# Altium footprint library LibPCB.PcbLib: 76 footprints (part 2 of 5)
Each footprint in its own frame and in the unit in brackets; x right, y up, seen from the top. Pads: shape width x height; smd on the part's side, far side on the other; paste and mask are expansions set on the pad; w line width, h text height; cw(c..) or ccw(c..) is an arc to the next point about the centre after c.
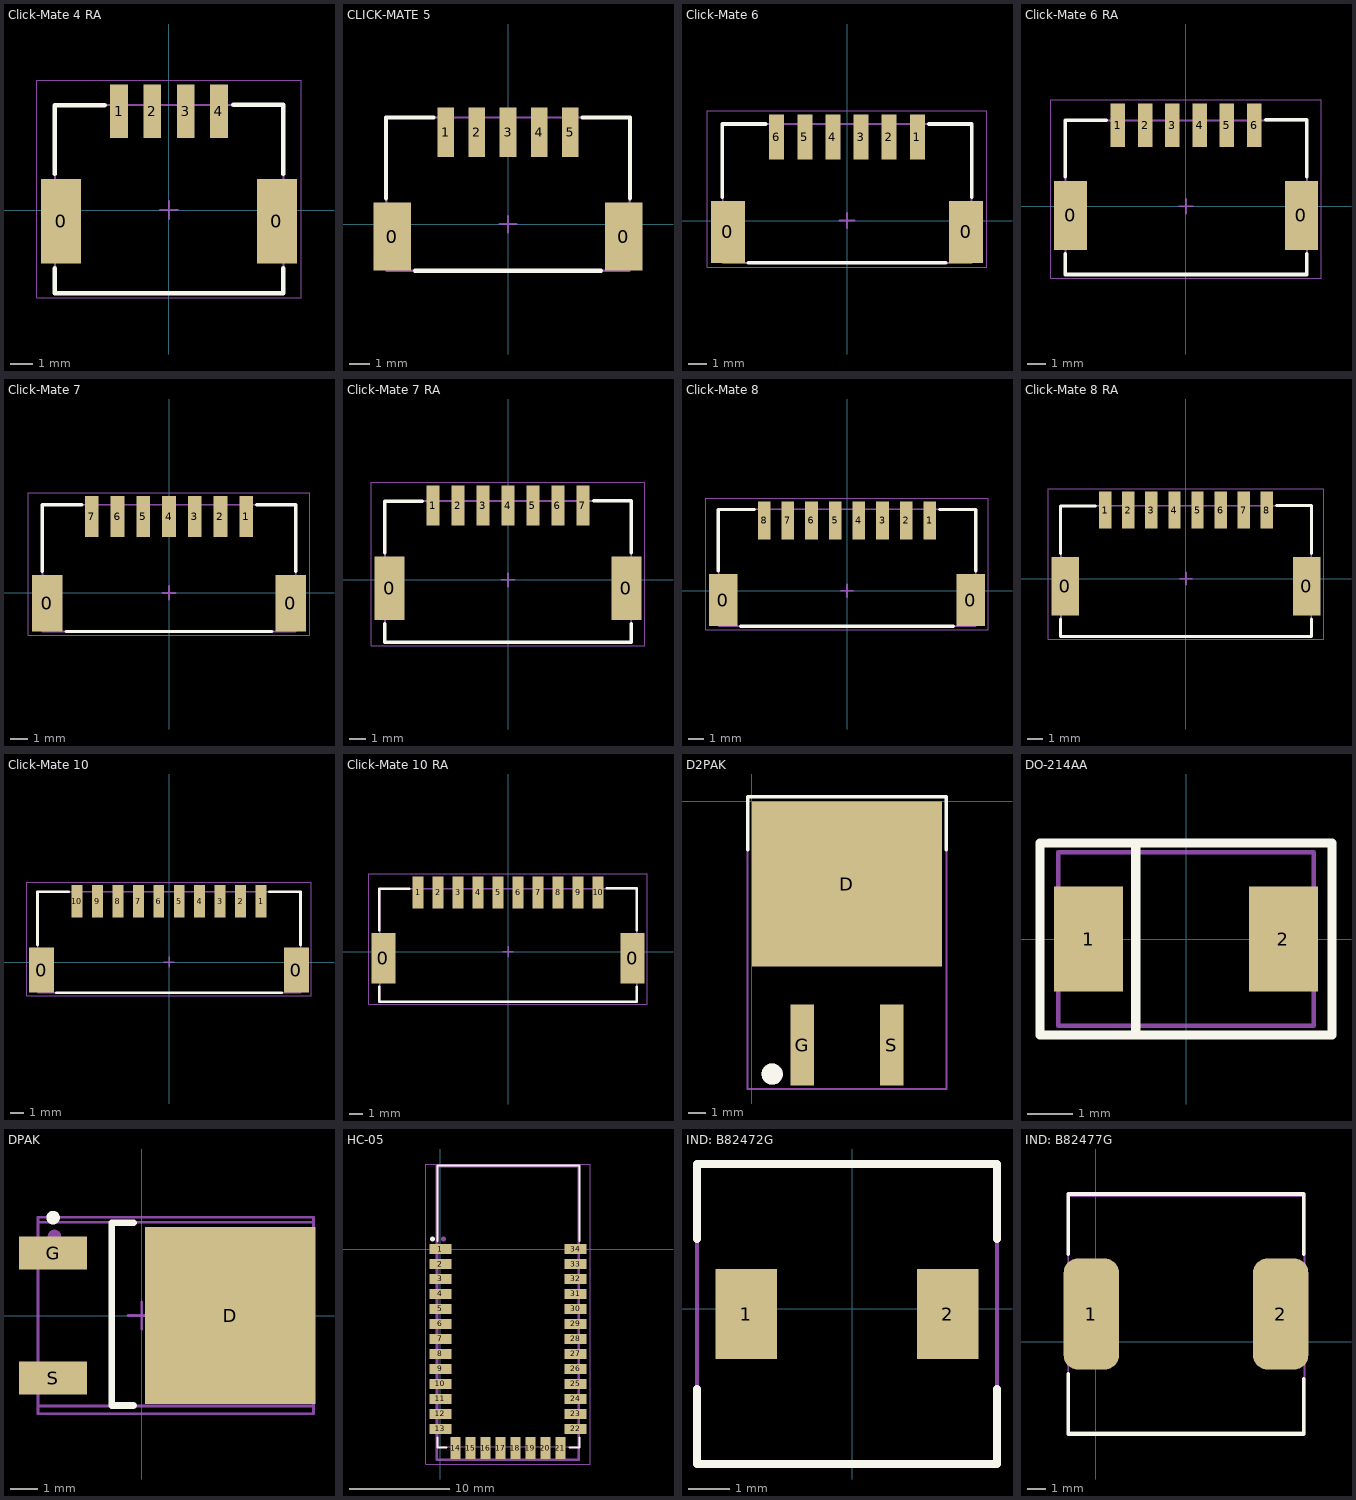
[diagram p1: the footprints below, top view; thin cyan lines are the x and y axes]

## Click-Mate 4 RA [mm]
pads (6):
  rect 1.8x3.8 smd: 0(-4.85,-0.5) 0(4.85,-0.5)
  rect 0.8x2.4 smd: 1(-2.25,4.45) 2(-0.75,4.45) 3(0.75,4.45) 4(2.25,4.45)
Top Overlay:
  lines w0.2: -5.15,-2.625 -5.15,-3.75 5.15,-3.75 5.15,-2.625 ; -5.15,1.625 -5.15,4.725 -2.9,4.725 ; 2.9,4.75 5.15,4.75 5.15,1.625
Mechanical 9:
  text ".Comment" at -0.925,-0.4 h0.6
  text ".Designator" at -1.05,0.15 h0.8
Mechanical 11:
  lines w0.1: 5.15,4.725 -5.125,4.725 -5.125,-3.775 5.15,-3.775 5.15,4.75
Mechanical 15:
  lines w0.05: -5.95,-3.95 5.95,-3.95 5.95,5.85 -5.95,5.85 -5.95,-3.95
  lines w0.1: -0.4,0 0.4,0 ; 0,-0.4 0,0.4
3D body "Click-Mate 4 RA.stp": height 6.4, standoff 0, extent -5.15,-3.78 5.15,4.72

## CLICK-MATE 5 [mm]
pads (7):
  rect 1.8x3.3 smd: 0(-5.6,-0.6) 0(5.6,-0.6)
  rect 0.8x2.4 smd: 1(-3,4.45) 2(-1.5,4.45) 3(0,4.45) 4(1.5,4.45) 5(3,4.45)
Top Overlay:
  lines w0.2: -5.9,1.25 -5.9,5.15 -3.6,5.15 ; -4.5,-2.25 4.5,-2.25 ; 3.6,5.15 5.9,5.15 5.9,1.25
Mechanical 9:
  text ".Comment" at -0.798,-0.4 h0.6
  text ".Designator" at -0.923,0.15 h0.8
Mechanical 11:
  lines w0.1: -5.875,-2.25 5.875,-2.25 5.875,5.15 -5.875,5.15 -5.875,-2.25
Mechanical 15:
  lines w0.1: -0.4,0 0.4,0 ; 0,-0.4 0,0.4
3D body "5025840570.stp": height 7.28, standoff -0.02, extent -5.831,-2.176 5.969,5.224

## Click-Mate 6 [mm] "5054050670"
pads (8):
  rect 1.8x3.3 smd: 0(-6.35,-0.6) 0(6.35,-0.6)
  rect 0.8x2.4 smd: 1(3.75,4.45) 2(2.25,4.45) 3(0.75,4.45) 4(-0.75,4.45) 5(-2.25,4.45) 6(-3.75,4.45)
Top Overlay:
  lines w0.2: -6.65,1.25 -6.65,5.15 -4.35,5.15 ; -5.25,-2.25 5.25,-2.25 ; 4.375,5.15 6.65,5.15 6.65,1.25
Mechanical 9:
  text ".Comment" at -0.925,-0.4 h0.6
  text ".Designator" at -1.05,0.15 h0.8
Mechanical 11:
  lines w0.1: -6.625,-2.25 6.65,-2.25 6.65,5.15 -6.625,5.15 -6.625,-2.25
Mechanical 15:
  lines w0.05: -7.45,-2.475 7.45,-2.475 7.45,5.85 -7.45,5.85 -7.45,-2.475
  lines w0.1: -0.4,0 0.4,0 ; 0,-0.4 0,0.4
3D body "Click-Mate 6 .stp": height 7.28, standoff -0.02, extent -6.65,-2.25 6.65,5.15

## Click-Mate 6 RA [mm]
pads (8):
  rect 1.8x3.8 smd: 0(-6.35,-0.5) 0(6.35,-0.5)
  rect 0.8x2.4 smd: 1(-3.75,4.45) 2(-2.25,4.45) 3(-0.75,4.45) 4(0.75,4.45) 5(2.25,4.45) 6(3.75,4.45)
Top Overlay:
  lines w0.2: -6.65,-2.625 -6.65,-3.75 6.65,-3.75 6.65,-2.625 ; -6.65,1.625 -6.65,4.725 -4.4,4.725 ; 4.4,4.75 6.65,4.75 6.65,1.625
Mechanical 9:
  text ".Designator" at -1.05,0.15 h0.8
  text ".Comment" at -0.925,-0.4 h0.6
Mechanical 11:
  lines w0.1: 6.65,4.725 -6.625,4.725 -6.625,-3.775 6.65,-3.775 6.65,4.75
Mechanical 15:
  lines w0.05: -7.45,-3.95 -7.45,5.85 7.45,5.85 7.45,-3.95 -7.45,-3.95
  lines w0.1: -0.4,0 0.4,0 ; 0,-0.4 0,0.4
3D body "Click-Mate 6.stp": height 6.4, standoff 0, extent -6.65,-3.78 6.65,4.72

## Click-Mate 7 [mm] "505405-0770"
pads (9):
  rect 1.8x3.3 smd: 0(-7.1,-0.6) 0(7.1,-0.6)
  rect 0.8x2.4 smd: 1(4.5,4.45) 2(3,4.45) 3(1.5,4.45) 4(0,4.45) 5(-1.5,4.45) 6(-3,4.45) 7(-4.5,4.45)
Top Overlay:
  lines w0.2: -7.4,1.25 -7.4,5.15 -5.1,5.15 ; -6,-2.25 6,-2.25 ; 5.125,5.15 7.4,5.15 7.4,1.25
Mechanical 9:
  text ".Designator" at -1.05,0.15 h0.8
  text ".Comment" at -0.925,-0.4 h0.6
Mechanical 11:
  lines w0.1: -7.375,-2.25 -7.375,5.15 7.4,5.15 7.4,-2.25 -7.375,-2.25
Mechanical 15:
  lines w0.05: -8.2,-2.475 -8.2,5.85 8.2,5.85 8.2,-2.475 -8.2,-2.475
  lines w0.1: -0.4,0 0.4,0 ; 0,-0.4 0,0.4
3D body "Clik-Mate 7.stp": height 7.28, standoff -0.02, extent -7.4,-2.25 7.4,5.15

## Click-Mate 7 RA [mm]
pads (9):
  rect 1.8x3.8 smd: 0(-7.1,-0.5) 0(7.1,-0.5)
  rect 0.8x2.4 smd: 1(-4.5,4.45) 2(-3,4.45) 3(-1.5,4.45) 4(0,4.45) 5(1.5,4.45) 6(3,4.45) 7(4.5,4.45)
Top Overlay:
  lines w0.2: -7.4,-2.625 -7.4,-3.75 7.4,-3.75 7.4,-2.625 ; -7.4,1.625 -7.4,4.725 -5.15,4.725 ; 5.15,4.75 7.4,4.75 7.4,1.625
Mechanical 9:
  text ".Comment" at -0.925,-0.4 h0.6
  text ".Designator" at -1.05,0.15 h0.8
Mechanical 11:
  lines w0.1: 7.4,4.725 -7.375,4.725 -7.375,-3.775 7.4,-3.775 7.4,4.75
Mechanical 15:
  lines w0.05: -8.2,-3.95 8.2,-3.95 8.2,5.85 -8.2,5.85 -8.2,-3.95
  lines w0.1: -0.4,0 0.4,0 ; 0,-0.4 0,0.4
3D body "Click-Mate 7 RA.stp": height 6.4, standoff 0, extent -7.4,-3.78 7.4,4.72

## Click-Mate 8 [mm] "5054050870"
pads (10):
  rect 1.8x3.3 smd: 0(-7.85,-0.6) 0(7.85,-0.6)
  rect 0.8x2.4 smd: 1(5.25,4.45) 2(3.75,4.45) 3(2.25,4.45) 4(0.75,4.45) 5(-0.75,4.45) 6(-2.25,4.45) 7(-3.75,4.45) 8(-5.25,4.45)
Top Overlay:
  lines w0.2: -8.15,1.25 -8.15,5.15 -5.85,5.15 ; -6.75,-2.25 6.75,-2.25 ; 5.875,5.15 8.15,5.15 8.15,1.25
Mechanical 9:
  text ".Designator" at -1.05,0.15 h0.8
  text ".Comment" at -0.925,-0.4 h0.6
Mechanical 11:
  lines w0.1: -8.125,-2.25 -8.125,5.15 8.15,5.15 8.15,-2.25 -8.125,-2.25
Mechanical 15:
  lines w0.05: -8.95,-2.475 -8.95,5.85 8.95,5.85 8.95,-2.475 -8.95,-2.475
  lines w0.1: -0.4,0 0.4,0 ; 0,-0.4 0,0.4
3D body "Clik-Mate 8.stp": height 7.28, standoff -0.02, extent -8.15,-2.25 8.15,5.15

## Click-Mate 8 RA [mm]
pads (10):
  rect 1.8x3.8 smd: 0(-7.85,-0.5) 0(7.85,-0.5)
  rect 0.8x2.4 smd: 1(-5.25,4.45) 2(-3.75,4.45) 3(-2.25,4.45) 4(-0.75,4.45) 5(0.75,4.45) 6(2.25,4.45) 7(3.75,4.45) 8(5.25,4.45)
Top Overlay:
  lines w0.2: -8.15,-2.625 -8.15,-3.75 8.15,-3.75 8.15,-2.625 ; -8.15,1.625 -8.15,4.725 -5.9,4.725 ; 5.9,4.75 8.15,4.75 8.15,1.625
Mechanical 9:
  text ".Designator" at -1.05,0.15 h0.8
  text ".Comment" at -0.925,-0.4 h0.6
Mechanical 11:
  lines w0.1: 8.15,4.725 -8.125,4.725 -8.125,-3.775 8.15,-3.775 8.15,4.75
Mechanical 15:
  lines w0.05: -8.95,-3.95 -8.95,5.85 8.95,5.85 8.95,-3.95 -8.95,-3.95
  lines w0.1: -0.4,0 0.4,0 ; 0,-0.4 0,0.4
3D body "Click-Mate 8 RA.stp": height 6.4, standoff 0, extent -8.15,-3.78 8.15,4.72

## Click-Mate 10 [mm] "505405-1070"
pads (12):
  rect 1.8x3.3 smd: 0(-9.35,-0.6) 0(9.35,-0.6)
  rect 0.8x2.4 smd: 1(6.75,4.45) 2(5.25,4.45) 3(3.75,4.45) 4(2.25,4.45) 5(0.75,4.45) 6(-0.75,4.45) 7(-2.25,4.45) 8(-3.75,4.45) 9(-5.25,4.45) 10(-6.75,4.45)
Top Overlay:
  lines w0.2: -9.65,1.25 -9.65,5.15 -7.35,5.15 ; -8.25,-2.25 8.25,-2.25 ; 7.375,5.15 9.65,5.15 9.65,1.25
Mechanical 9:
  text ".Designator" at -1.05,0.15 h0.8
  text ".Comment" at -0.925,-0.4 h0.6
Mechanical 11:
  lines w0.1: -9.625,-2.25 -9.625,5.15 9.65,5.15 9.65,-2.25 -9.625,-2.25
Mechanical 15:
  lines w0.05: -10.45,-2.475 -10.45,5.85 10.45,5.85 10.45,-2.475 -10.45,-2.475
  lines w0.1: -0.4,0 0.4,0 ; 0,-0.4 0,0.4
3D body "Click-Mate 10.stp": height 7.28, standoff -0.02, extent -9.65,-2.25 9.65,5.15

## Click-Mate 10 RA [mm] "5025851070"
pads (12):
  rect 1.8x3.8 smd: 0(-9.35,-0.5) 0(9.35,-0.5)
  rect 0.8x2.4 smd: 1(-6.75,4.45) 2(-5.25,4.45) 3(-3.75,4.45) 4(-2.25,4.45) 5(-0.75,4.45) 6(0.75,4.45) 7(2.25,4.45) 8(3.75,4.45) 9(5.25,4.45) 10(6.75,4.45)
Top Overlay:
  lines w0.2: -9.65,-2.625 -9.65,-3.75 9.65,-3.75 9.65,-2.625 ; -9.65,1.625 -9.65,4.725 -7.4,4.725 ; 7.4,4.75 9.65,4.75 9.65,1.625
Mechanical 9:
  text ".Comment" at -0.925,-0.4 h0.6
  text ".Designator" at -1.05,0.15 h0.8
Mechanical 11:
  lines w0.1: 9.65,4.725 -9.625,4.725 -9.625,-3.775 9.65,-3.775 9.65,4.75
Mechanical 15:
  lines w0.05: -10.45,-3.95 10.45,-3.95 10.45,5.85 -10.45,5.85 -10.45,-3.95
  lines w0.1: -0.4,0 0.4,0 ; 0,-0.4 0,0.4
3D body "CLICK-Mate 10 RA - 5025851070.stp": height 6.4, standoff 0, extent -9.65,-3.78 9.65,4.72

## D2PAK [mm]
pads (3):
  rrect0% 10.8x9.4 smd: D(5.4,-4.7)
  rrect0% 1.35x4.6 smd: G(2.86,-13.85) S(7.94,-13.85)
Top Overlay:
  circle w0.6: c1.15,-15.5 r0.3
  lines w0.2: -0.25,-2.75 -0.25,0.25 11.05,0.25 11.05,-2.75
Mechanical 9:
  text ".Comment" at 4.05,-10.95 h0.6
  text ".Designator" at 3.625,-10.35 h0.8
Mechanical 11:
  circle w0.6: c1.15,-15.5 r0.3
  lines w0.1: -0.25,-16.35 -0.25,0.25 11.05,0.25 11.05,-16.35 -0.25,-16.35
3D body "User Library-TO263-3S.STEP": height 4.78, standoff -0.02, extent 0.4,-15.89 10.4,-0.22

## DO-214AA [mm]
height 2
pads (2):
  rrect0% 1.52x2.3 smd: 1(-2.135,0) 2(2.135,0)
Top Overlay:
  lines w0.2: -1.1,-2.1 -1.1,2.1 ; -3.2,-2.1 -3.2,2.1 3.2,2.1 3.2,-2.1 -3.2,-2.1
Mechanical 1:
  lines w0.1: -2.8,-1.9 -2.8,1.9 2.8,1.9 2.8,-1.9 -2.8,-1.9
Mechanical 9:
  text ".Designator" at -1.581,0.303 h0.8
  text ".Comment" at -1.181,-0.397 h0.6
Mechanical 11:
  lines w0.1: -3.2,-2.1 -3.2,2.1 3.2,2.1 3.2,-2.1 -3.2,-2.1
3D body "SMB.STEP": height 2.4, standoff 0, extent -2.8,-1.9 2.8,1.9

## DPAK [mm] "D-Pak, Body 6,2x6,7mm"
height 2.4
pads (4):
  rect 6.25x6.5 smd: D(3.25,0)
  rect 2.5x1.2 smd: G(-3.25,2.29) S(-3.25,-2.29)
  round 0.5 on Mech1: ""(-3.2,2.9)
Top Overlay:
  circle w0.25: c-3.25,3.59 r0.125
  lines w0.25: -0.3,-3.3 -1.1,-3.3 -1.1,3.4 -0.3,3.4
Mechanical 1:
  lines w0.1: -3.798,-3.317 6.302,-3.317 6.302,3.417 ; -3.798,-3.317 -3.798,-3.317 ; -3.798,-3.317 -3.798,3.417 6.302,3.417 ; 6.302,3.417 6.302,3.417
Mechanical 15:
  lines w0.1: -0.5,0 0.5,0 ; 0,-0.5 0,0.5 ; -3.8,-3.6 -3.8,3.6 6.3,3.6 6.3,-3.6 -3.8,-3.6
3D body "User Library-DPAK_TO-252AA.STEP": height 2.37, standoff -0.03, extent -3.798,-3.317 6.302,3.417

## HC-05 [mm] "Bluetooth 2.0 module"
height 2
pads (36):
  rect 2.2x1 smd: 1(0,0) 2(0,-1.5) 3(0,-3) 4(0,-4.5) 5(0,-6) 6(0,-7.5) 7(0,-9) 8(0,-10.5) 9(0,-12) 10(0,-13.5) 11(0,-15) 12(0,-16.5) 13(0,-18) 22(13.5,-18) 23(13.5,-16.5) 24(13.5,-15) 25(13.5,-13.5) 26(13.5,-12) 27(13.5,-10.5) 28(13.5,-9) 29(13.5,-7.5) 30(13.5,-6) 31(13.5,-4.5) 32(13.5,-3) 33(13.5,-1.5) 34(13.5,0)
  rect 1x2.2 smd: 14(1.5,-19.9) 15(3,-19.9) 16(4.5,-19.9) 17(6,-19.9) 18(7.5,-19.9) 19(9,-19.9) 20(10.5,-19.9) 21(12,-19.9)
  round 0.5 on Mech1: 33(0.3,1)
  round 0.5 on Top Overlay: 34(-0.8,1)
Top Overlay:
  lines w0.2: -0.3,-18.875 -0.3,-19.85 0.625,-19.85 ; -0.3,0.8 -0.3,8.35 13.9,8.35 13.9,0.8 ; 12.875,-19.85 13.9,-19.85 13.9,-18.875
Mechanical 1:
  lines w0.1: -0.21,-19.76 13.81,-19.76 13.81,8.25 -0.21,8.25 -0.21,-19.76
Mechanical 9:
  text ".Comment" at 7.385,-8.418 h0.6
  text ".Designator" at 6.835,-8.543 h0.8
Mechanical 11:
  lines w0.254: -0.381,-21.082 13.843,-21.082 13.843,8.255 -0.381,8.255 -0.381,-21.082
Mechanical 15:
  lines w0.1: -1.5,-21.5 -1.5,8.5 15,8.5 15,-21.5 -1.5,-21.5
3D body "HC-05.step": height 2.35, standoff 0, extent -0.21,-19.76 13.81,8.25

## IND: B82472G [mm]
pads (2):
  rrect0% 1.5x2.2 smd: 1(-2.577,-0.127) 2(2.323,-0.127)
Top Overlay:
  lines w0.2: -3.777,-1.952 -3.777,-3.777 3.523,-3.777 3.523,-1.952 ; -3.777,1.698 -3.777,3.523 3.523,3.523 3.523,1.698
Mechanical 1:
  lines w0.1: -3.777,-3.777 -3.777,3.523 3.523,3.523 3.523,-3.777 -3.777,-3.777
Mechanical 9:
  text ".Designator" at -1.581,0.303 h0.8
  text ".Comment" at -1.181,-0.397 h0.6
Mechanical 11:
  lines w0.1: -3.777,-3.777 3.523,-3.777 3.523,3.523 -3.777,3.523 -3.777,-3.777
3D body "IND_EPCOS_B82472G6.stp": height 4.5, standoff 0, extent -3.874,-3.876 3.62,3.622

## IND: B82477G [mm]
pads (2):
  rrect50% 3x6 smd: 1(-0.25,1.5) 2(10,1.5)
Top Overlay:
  lines w0.2: -1.5,-1.75 -1.5,-5 11.25,-5 11.25,-2 ; -1.5,4.75 -1.5,8 11.25,8 11.25,4.75
Mechanical 1:
  lines w0.1: -1.5,-4.9 -1.5,7.9 11.3,7.9 11.3,-4.9 -1.5,-4.9
Mechanical 9:
  text ".Comment" at 3.645,0.619 h0.6
  text ".Designator" at 3.245,1.319 h0.8
Mechanical 15:
  lines w0.1: -1.5,-5 -1.5,8 11.2,8 11.3,8 11.3,4 11.3,-5 -1.5,-5
3D body "User Library-b82477g4.STEP": height 8, standoff 0, extent -1.5,-4.9 11.3,7.9